# Altium footprint library Sirius.PcbLib: 58 footprints (part 2 of 4)
Each footprint in its own frame and in the unit in brackets; x right, y up, seen from the top. Pads: shape width x height; smd on the part's side, far side on the other; paste and mask are expansions set on the pad; w line width, h text height; cw(c..) or ccw(c..) is an arc to the next point about the centre after c.
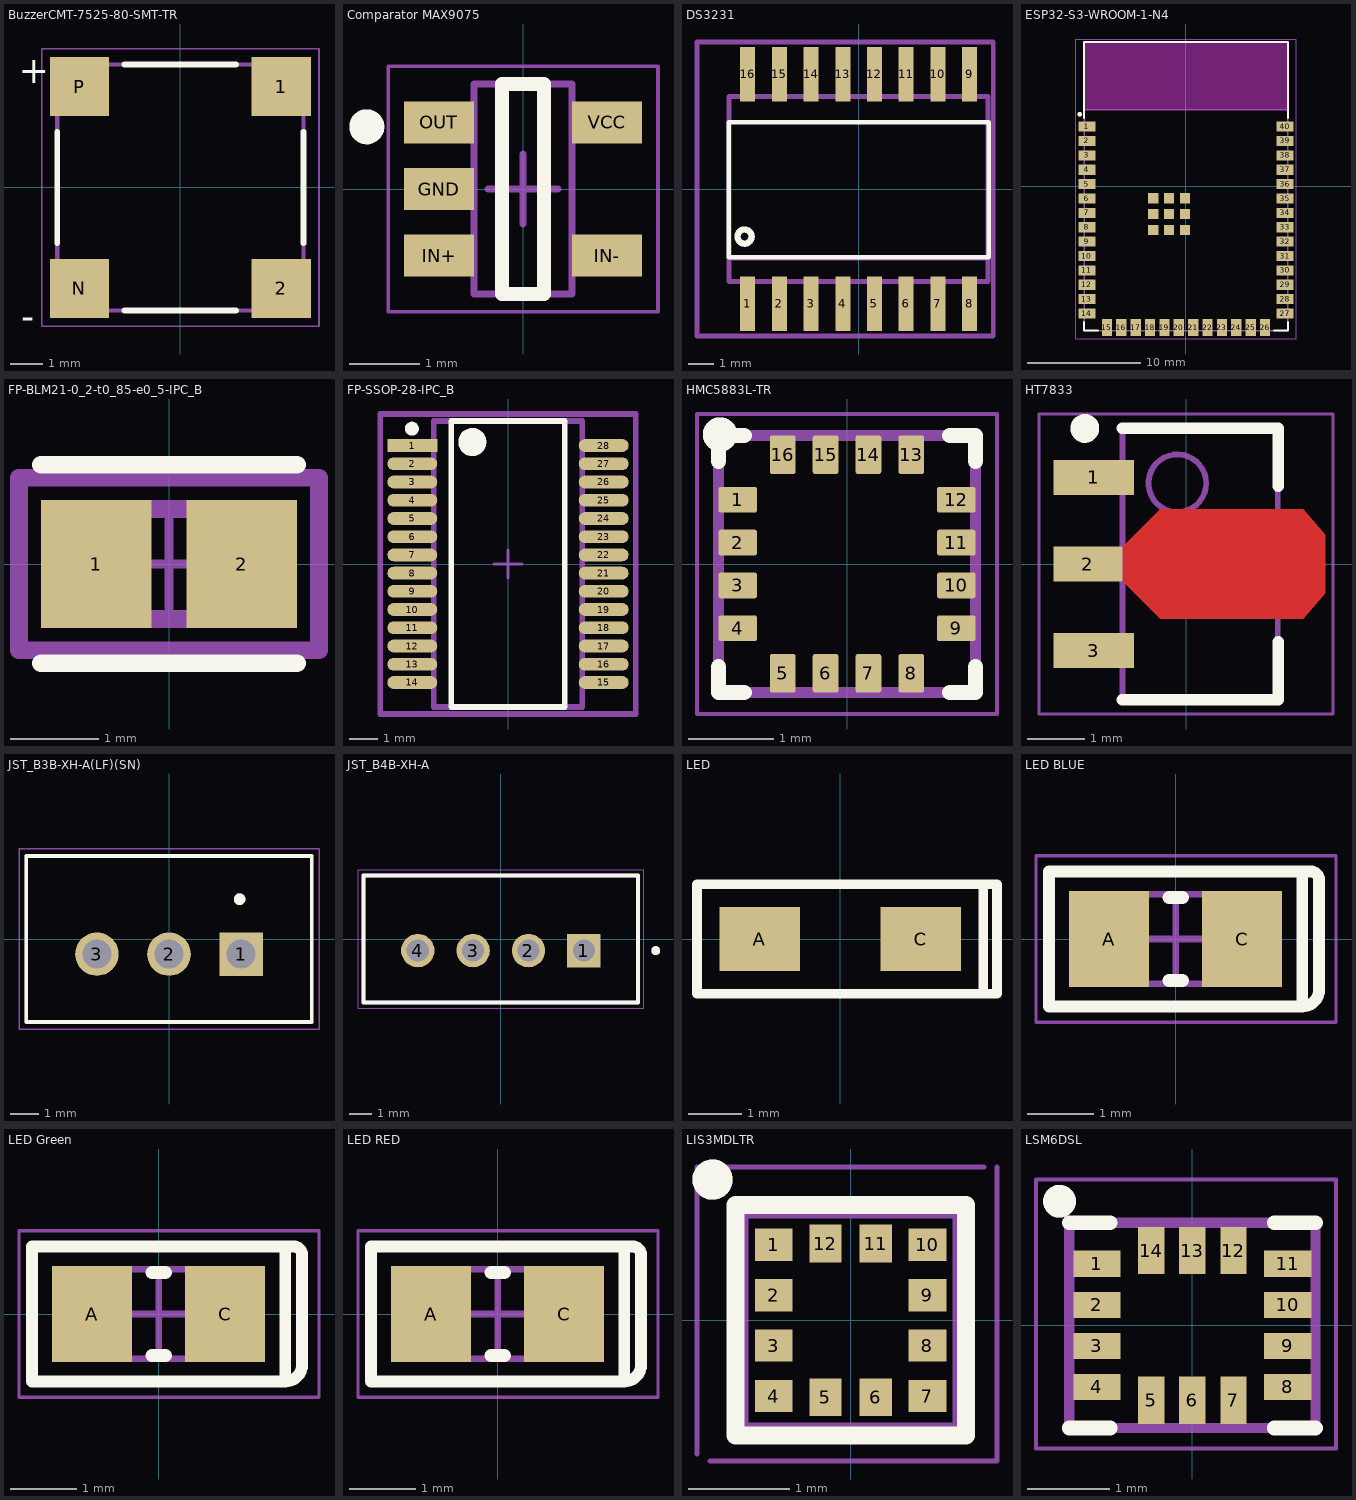
[diagram p1: the footprints below, top view; thin cyan lines are the x and y axes]

## BuzzerCMT-7525-80-SMT-TR [mm] "Passive Buzzer"
height 2.5
pads (4):
  rect 1.8x1.8 smd: 1(3.075,3.075) 2(3.075,-3.075) N(-3.075,-3.075) P(-3.075,3.075)
Top Overlay:
  lines w0.178: -3.75,-1.7 -3.75,1.7 ; -1.7,-3.75 1.7,-3.75 ; -1.7,3.75 1.7,3.75 ; 3.75,-1.7 3.75,1.7
  text "+" at -4.915,3.175 h0.81
  text "-" at -4.842,-4.318 h0.81
Mechanical 13:
  lines w0.127: -3.75,-3.75 -3.75,3.75 3.75,3.75 3.75,-3.75 -3.75,-3.75
  text "+" at -4.915,3.175 h0.81
  text "-" at -4.842,-4.318 h0.81
Mechanical 15:
  lines w0.05: -4.225,-4.225 4.225,-4.225 4.225,4.225 -4.225,4.225 -4.225,-4.225
3D body "Buzzzer CMT-7525-80-SMT-TR--3DModel-STEP-1.STEP": height 2.5, standoff 0, extent -3.75,-3.75 3.75,3.75

## Comparator MAX9075 [mm] "SOT23, 5-Leads, Body 2.90x2.45mm, Pitch 0.95mm, IPC Medium Density"
height 0.9
pads (5):
  rect 1x0.6 smd: GND(-1.2,0) IN+(-1.2,-0.95) IN-(1.2,-0.95) OUT(-1.2,0.95) VCC(1.2,0.95)
Top Overlay:
  circle w0.25: c-2.235,0.889 r0.125
  lines w0.2: -0.3,-1.5 -0.3,1.5 0.3,1.5 0.3,-1.5 -0.3,-1.5
Top Courtyard:
  lines w0.05: -1.925,-1.75 1.925,-1.75 1.925,1.75 -1.925,1.75 -1.925,-1.75
  lines w0.1: -0.5,0 0.5,0 ; 0,-0.5 0,0.5
Top Assembly:
  lines w0.1: -0.7,-1.5 0.7,-1.5 0.7,1.5 -0.7,1.5 -0.7,-1.5
3D body "SOT95P245X90-5N.step": height 0.9, standoff 0, extent -1.3,-1.5 1.3,1.5

## DS3231 [mm] "RTC"
pads (16):
  rect 0.6x2.2 smd: 1(-4.445,-4.6) 2(-3.175,-4.6) 3(-1.905,-4.6) 4(-0.635,-4.6) 5(0.635,-4.6) 6(1.905,-4.6) 7(3.175,-4.6) 8(4.445,-4.6) 9(4.445,4.6) 10(3.175,4.6) 11(1.905,4.6) 12(0.635,4.6) 13(-0.635,4.6) 14(-1.905,4.6) 15(-3.175,4.6) 16(-4.445,4.6)
Top Overlay:
  circle w0.254: c-4.572,-1.905 r0.284
  lines w0.178: -5.207,-2.743 5.207,-2.743 5.207,2.667 -5.207,2.667 -5.207,-2.743
Mechanical 13:
  region: -4.2,-5.32 -4.69,-5.32 -4.69,-3.8 -4.2,-3.8
  region: -2.93,-5.32 -3.42,-5.32 -3.42,-3.8 -2.93,-3.8
  region: -1.66,-5.32 -2.15,-5.32 -2.15,-3.8 -1.66,-3.8
  region: -0.39,-5.32 -0.88,-5.32 -0.88,-3.8 -0.39,-3.8
  region: 0.88,-5.32 0.39,-5.32 0.39,-3.8 0.88,-3.8
  region: 2.15,-5.32 1.66,-5.32 1.66,-3.8 2.15,-3.8
  region: 3.42,-5.32 2.93,-5.32 2.93,-3.8 3.42,-3.8
  region: 4.69,-5.32 4.2,-5.32 4.2,-3.8 4.69,-3.8
  region: 4.69,3.8 4.2,3.8 4.2,5.32 4.69,5.32
  region: 3.42,3.8 2.93,3.8 2.93,5.32 3.42,5.32
  region: 2.15,3.8 1.66,3.8 1.66,5.32 2.15,5.32
  region: 0.88,3.8 0.39,3.8 0.39,5.32 0.88,5.32
  region: -0.39,3.8 -0.88,3.8 -0.88,5.32 -0.39,5.32
  region: -1.66,3.8 -2.15,3.8 -2.15,5.32 -1.66,5.32
  region: -2.93,3.8 -3.42,3.8 -3.42,5.32 -2.93,5.32
  region: -4.2,3.8 -4.69,3.8 -4.69,5.32 -4.2,5.32
  lines w0.203: -5.19,-3.2 -5.19,3.7 5.19,3.7 5.19,-3.2 ; -5.19,-3.7 5.19,-3.7 5.19,-2.769 -5.19,-2.769 -5.19,-3.7
Mechanical 15:
  lines w0.2: -6.477,-5.9 5.395,-5.9 5.395,5.9 -6.477,5.9 -6.477,-5.9
3D body "step_temp.STEP": height 2.65, standoff 0, extent -5.15,-5.162 5.15,5.162

## ESP32-S3-WROOM-1-N4 [mm]
height 3.25
pads (49):
  rect 1.5x0.9 smd: 1(-8.75,5.26) 2(-8.75,3.99) 3(-8.75,2.72) 4(-8.75,1.45) 5(-8.75,0.18) 6(-8.75,-1.09) 7(-8.75,-2.36) 8(-8.75,-3.63) 9(-8.75,-4.9) 10(-8.75,-6.17) 11(-8.75,-7.44) 12(-8.75,-8.71) 13(-8.75,-9.98) 14(-8.75,-11.25) 27(8.75,-11.25) 28(8.75,-9.98) 29(8.75,-8.71) 30(8.75,-7.44) 31(8.75,-6.17) 32(8.75,-4.9) 33(8.75,-3.63) 34(8.75,-2.36) 35(8.75,-1.09) 36(8.75,0.18) 37(8.75,1.45) 38(8.75,2.72) 39(8.75,3.99) 40(8.75,5.26)
  rect 0.9x1.5 smd: 15(-6.985,-12.5) 16(-5.715,-12.5) 17(-4.445,-12.5) 18(-3.175,-12.5) 19(-1.905,-12.5) 20(-0.635,-12.5) 21(0.635,-12.5) 22(1.905,-12.5) 23(3.175,-12.5) 24(4.445,-12.5) 25(5.715,-12.5) 26(6.985,-12.5)
  rect 0.9x0.9 smd: 41_1(-1.5,-2.46) 41_2(-2.9,-2.46) 41_3(-0.1,-2.46) 41_4(-2.9,-3.86) 41_5(-1.5,-3.86) 41_6(-0.1,-3.86) 41_7(-2.9,-1.06) 41_8(-1.5,-1.06) 41_9(-0.1,-1.06)
Top Overlay:
  circle w0.2: c-9.398,6.35 r0.1
  lines w0.178: -9,-12.02 -9,-12.75 -7.755,-12.75 ; -9,6.03 -9,12.75 9,12.75 9,6.03 ; 7.755,-12.75 9,-12.75 9,-12.02
Keep-Out Layer:
  region: 9,6.75 -9,6.75 -9,12.75 9,12.75
  region: 9,6.75 -9,6.75 -9,12.75 9,12.75
Mechanical 13:
  circle w0.2: c-9.398,6.35 r0.1
  lines w0.127: -9,6.75 9,6.75 ; -9,6.75 -9,12.75 9,12.75 9,6.75 ; -9,6.75 -9,-12.75 9,-12.75 9,6.75
Mechanical 15:
  lines w0.05: -9.75,-13.5 9.75,-13.5 9.75,13 -9.75,13 -9.75,-13.5
3D body "ESP32-S3-WROOM-1-N4.STEP": height 3.25, standoff 0, extent -9,-12.75 9,12.75

## FP-BLM21-0_2-t0_85-e0_5-IPC_B [mm] "Murata-Ferrite Beads Multi-Layer 1KOhm 25% 100MHz 0.6A 0.27Ohm DCR 0805 T/R"
pads (2):
  rect 1.255x1.456 smd paste+0 mask+0: 1(-0.826,0) 2(0.826,0)
Top Overlay:
  lines w0.2: -1.453,-1.128 1.453,-1.128 ; -1.453,1.128 1.453,1.128
Top 3D Body:
  lines w0.2: -1,-0.625 -1,0.625 1,0.625 1,-0.625 -1,-0.625
Top Courtyard:
  lines w0.2: -1.703,-0.978 -1.703,0.978 1.703,0.978 1.703,-0.978 -1.703,-0.978
Top Assembly:
  lines w0.2: -1.703,-0.978 -1.703,0.978 1.703,0.978 1.703,-0.978 -1.703,-0.978
Top Component Center:
  lines w0.1: -0.5,0 0.5,0 ; 0,-0.5 0,0.5
3D body "FBead_Murata_BLM21AG102SN1D_eec.STEP": height 0.25, standoff 0, extent -1.703,-0.978 1.703,0.978

## FP-SSOP-28-IPC_B [mm]
pads (28):
  rect 1.782x0.455 smd paste+0 mask+0: 1(-3.414,4.225)
  rrect100% 1.782x0.455 smd paste+0 mask+0: 2(-3.414,3.575) 3(-3.414,2.925) 4(-3.414,2.275) 5(-3.414,1.625) 6(-3.414,0.975) 7(-3.414,0.325) 8(-3.414,-0.325) 9(-3.414,-0.975) 10(-3.414,-1.625) 11(-3.414,-2.275) 12(-3.414,-2.925) 13(-3.414,-3.575) 14(-3.414,-4.225) 15(3.414,-4.225) 16(3.414,-3.575) 17(3.414,-2.925) 18(3.414,-2.275) 19(3.414,-1.625) 20(3.414,-0.975) 21(3.414,-0.325) 22(3.414,0.325) 23(3.414,0.975) 24(3.414,1.625) 25(3.414,2.275) 26(3.414,2.925) 27(3.414,3.575) 28(3.414,4.225)
Top Overlay:
  circle w0.25: c-3.429,4.826 r0.125
  circle w0.5: c-1.273,4.35 r0.25
  lines w0.2: -2.023,-5.1 -2.023,5.1 2.023,5.1 2.023,-5.1 -2.023,-5.1
Top 3D Body:
  lines w0.2: -2.65,-5.1 -2.65,5.1 2.65,5.1 2.65,-5.1 -2.65,-5.1
Top Courtyard:
  lines w0.2: -4.555,-5.35 -4.555,5.35 4.555,5.35 4.555,-5.35 -4.555,-5.35
Top Assembly:
  lines w0.2: -4.555,-5.35 -4.555,5.35 4.555,5.35 4.555,-5.35 -4.555,-5.35
Top Component Center:
  lines w0.1: -0.5,0 0.5,0 ; 0,-0.5 0,0.5
3D body "IC_FTDI_FT232RL-REEL_eec.STEP": height 0.25, standoff 0, extent -4.555,-5.35 4.555,5.35

## HMC5883L-TR [mm]
pads (16):
  rrect17% 0.45x0.3 smd: 1(-1.275,0.75) 2(-1.275,0.25) 3(-1.275,-0.25) 4(-1.275,-0.75) 9(1.275,-0.75) 10(1.275,-0.25) 11(1.275,0.25) 12(1.275,0.75)
  rrect17% 0.3x0.45 smd: 5(-0.75,-1.275) 6(-0.25,-1.275) 7(0.25,-1.275) 8(0.75,-1.275) 13(0.75,1.275) 14(0.25,1.275) 15(-0.25,1.275) 16(-0.75,1.275)
Top Overlay:
  circle w0.2: c-1.481,1.512 r0.1
  lines w0.178: -1.5,-1.2 -1.5,-1.5 -1.2,-1.5 ; -1.5,1.2 -1.5,1.5 -1.2,1.5 ; 1.2,-1.5 1.5,-1.5 1.5,-1.2 ; 1.2,1.5 1.5,1.5 1.5,1.2
Mechanical 13:
  circle w0.2: c-1.481,1.512 r0.1
  lines w0.127: -1.5,-1.5 1.5,-1.5 1.5,1.5 -1.5,1.5 -1.5,-1.5
Mechanical 15:
  lines w0.05: -1.75,-1.75 -1.75,1.75 1.75,1.75 1.75,-1.75 -1.75,-1.75
3D body "HMC5883L-TR.STEP": height 0.9, standoff 0, extent -1.5,-1.5 1.5,1.5

## HT7833 [mm] "SOT89, 3-Leads, Body 4.54x2.49mm, Pitch 1.50mm, Lead Span 3.5mm, IPC Medium Density"
height 1.6
pads (3):
  rect 1.4x0.6 smd: 1(-1.6,1.5) 3(-1.6,-1.5)
  rect 1.2x0.6 smd: 2(-1.7,0)
Top Layer:
  region: -1.1,0.3 -0.45,0.95 2.032,0.95 2.413,0.508 2.413,-0.508 2.032,-0.95 -0.45,-0.95 -1.1,-0.3
Top Overlay:
  circle w0.25: c-1.755,2.35 r0.125
  lines w0.2: -1.105,-2.35 1.595,-2.35 1.595,-1.35 ; -1.105,2.35 1.595,2.35 1.595,1.35
Top Courtyard:
  lines w0.05: -2.55,-2.6 -2.55,2.6 2.55,2.6 2.55,-2.6 -2.55,-2.6
  lines w0.1: -0.255,0 0.745,0 ; 0.245,-0.5 0.245,0.5
Top Assembly:
  circle w0.1: c-0.15,1.4 r0.5
  lines w0.1: -1.1,-2.35 -1.1,2.35 1.59,2.35 1.59,-2.35 -1.1,-2.35
3D body "SOT89-150P350X160-3N.step": height 1.6, standoff 0, extent -2.246,-2.349 1.954,2.349

## JST_B3B-XH-A(LF)(SN) [mm]
height 7
pads (3):
  rect 1.508x1.508 / inner round 1.508 / far side rect 1.508x1.508 hole 1: 1(2.5,-0.525)
  round 1.508 hole 1: 2(0,-0.525) 3(-2.5,-0.525)
Top Overlay:
  circle w0.2: c2.448,1.38 r0.1
  lines w0.127: 4.95,-2.875 4.95,2.875 ; 4.95,-2.875 -4.95,-2.875 -4.95,2.875 4.95,2.875 ; 4.95,-2.875 4.95,2.875
Mechanical 13:
  circle w0.2: c2.448,1.38 r0.1
  lines w0.127: 4.95,-2.875 -4.95,-2.875 -4.95,2.875 4.95,2.875
Mechanical 15:
  lines w0.05: -5.2,-3.125 5.2,-3.125 5.2,3.125 -5.2,3.125 -5.2,-3.125
3D body "step_temp.STEP": height 7, standoff -3.4, extent -4.95,-2.875 4.95,2.875

## JST_B4B-XH-A [mm]
height 7
pads (4):
  rect 1.508x1.508 / inner round 1.508 / far side rect 1.508x1.508 hole 1: 1(3.75,-0.525)
  round 1.508 hole 1: 2(1.25,-0.525) 3(-1.25,-0.525) 4(-3.75,-0.525)
Top Overlay:
  circle w0.2: c7,-0.525 r0.1
  lines w0.178: -6.2,-2.875 6.2,-2.875 6.2,2.875 -6.2,2.875 -6.2,-2.875
Mechanical 13:
  circle w0.2: c7,-0.525 r0.1
  lines w0.178: -6.2,-2.875 6.2,-2.875 6.2,2.875 -6.2,2.875 -6.2,-2.875
Mechanical 15:
  lines w0.05: -6.45,-3.125 6.45,-3.125 6.45,3.125 -6.45,3.125 -6.45,-3.125
3D body "JST-B4B-XH-A.step": height 7, standoff -3.4, extent -6.177,-2.875 6.223,2.875

## LED [mm] "1206"
pads (2):
  rect 1.5x1.2 smd: A(-1.5,0) C(1.5,0)
Top Overlay:
  lines w0.178: 2.667,-1.016 2.667,1.016 ; -2.667,-1.016 2.921,-1.016 2.921,1.016 -2.667,1.016 -2.667,-1.016
3D body "LED.STEP": height 1.1, standoff 0, extent -1.6,-0.8 1.6,0.8

## LED BLUE [mm] "0805"
pads (2):
  rect 1.2x1.45 smd: A(-1,0) C(1,0)
Top Overlay:
  lines w0.178: 1.905,-1.016 ccw(c1.905,-0.762) 2.159,-0.762 2.159,0.889 ccw(c2.032,0.889) 2.032,1.016 1.905,1.016 ; 1.905,-1.016 -1.905,-1.016 -1.905,1.016 1.905,1.016 ; 1.905,-1.016 1.905,1.016
  lines w0.2: -0.1,-0.625 0.1,-0.625 ; -0.1,0.625 0.1,0.625
Mechanical 13:
  lines w0.1: -1.05,-0.675 1.05,-0.675 1.05,0.675 -1.05,0.675 -1.05,-0.675
Mechanical 15:
  lines w0.05: -2.1,-1.25 2.413,-1.25 2.413,1.25 -2.1,1.25 -2.1,-1.25
  lines w0.1: -0.5,0 0.5,0 ; 0,-0.5 0,0.5
3D body "SMD_0805LED_BLU.STEP": height 1.1, standoff 0, extent -1.01,-0.625 1.01,0.625

## LED Green [mm] "0805"
pads (2):
  rect 1.2x1.45 smd: A(-1,0) C(1,0)
Top Overlay:
  lines w0.178: 1.905,-1.016 ccw(c1.905,-0.762) 2.159,-0.762 2.159,0.889 ccw(c2.032,0.889) 2.032,1.016 1.905,1.016 ; 1.905,-1.016 1.905,1.016 ; 1.905,-1.016 -1.905,-1.016 -1.905,1.016 1.905,1.016
  lines w0.2: -0.1,-0.625 0.1,-0.625 ; -0.1,0.625 0.1,0.625
Mechanical 13:
  lines w0.1: -1.05,-0.675 -1.05,0.675 1.05,0.675 1.05,-0.675 -1.05,-0.675
Mechanical 15:
  lines w0.05: -2.1,-1.25 -2.1,1.25 2.413,1.25 2.413,-1.25 -2.1,-1.25
  lines w0.1: -0.5,0 0.5,0 ; 0,-0.5 0,0.5
3D body "LED-0805-green.step": height 0.8, standoff -0.01, extent -1,-0.625 1,0.625

## LED RED [mm] "0805"
pads (2):
  rect 1.2x1.45 smd: A(-1,0) C(1,0)
Top Overlay:
  lines w0.178: 1.905,-1.016 ccw(c1.905,-0.762) 2.159,-0.762 2.159,0.889 ccw(c2.032,0.889) 2.032,1.016 1.905,1.016 ; 1.905,-1.016 1.905,1.016 ; 1.905,-1.016 -1.905,-1.016 -1.905,1.016 1.905,1.016
  lines w0.2: -0.1,-0.625 0.1,-0.625 ; -0.1,0.625 0.1,0.625
Mechanical 13:
  lines w0.1: -1.05,-0.675 -1.05,0.675 1.05,0.675 1.05,-0.675 -1.05,-0.675
Mechanical 15:
  lines w0.05: -2.1,-1.25 -2.1,1.25 2.413,1.25 2.413,-1.25 -2.1,-1.25
  lines w0.1: -0.5,0 0.5,0 ; 0,-0.5 0,0.5
3D body "SMD_0805LED_RED.STEP": height 1.1, standoff 0, extent -1.01,-0.625 1.01,0.625

## LIS3MDLTR [mm]
pads (12):
  rect 0.375x0.32 smd mask+0: 1(-0.763,0.75) 2(-0.763,0.25) 3(-0.763,-0.25) 4(-0.763,-0.75) 7(0.763,-0.75) 8(0.763,-0.25) 9(0.763,0.25) 10(0.763,0.75)
  rect 0.32x0.375 smd mask+0: 5(-0.25,-0.763) 6(0.25,-0.763) 11(0.25,0.763) 12(-0.25,0.763)
Top Overlay:
  circle w0.2: c-1.37,1.397 r0.1
  lines w0.178: -1.143,-1.143 1.143,-1.143 1.143,1.143 -1.143,1.143 -1.143,-1.143
Top Solder:
  region: -0.525,0.525 -1,0.525 -1,0.975 -0.525,0.975
  region: 0.475,-1 0.025,-1 0.025,-0.525 0.475,-0.525
  region: 0.475,0.525 0.025,0.525 0.025,1 0.475,1
  region: -0.025,0.525 -0.475,0.525 -0.475,1 -0.025,1
  region: -0.025,-1 -0.475,-1 -0.475,-0.525 -0.025,-0.525
  region: 1,-0.975 0.525,-0.975 0.525,-0.525 1,-0.525
  region: 1,-0.475 0.525,-0.475 0.525,-0.025 1,-0.025
  region: 1,0.025 0.525,0.025 0.525,0.475 1,0.475
  region: -0.525,-0.975 -1,-0.975 -1,-0.525 -0.525,-0.525
  region: -0.525,-0.475 -1,-0.475 -1,-0.025 -0.525,-0.025
  region: -0.525,0.025 -1,0.025 -1,0.475 -0.525,0.475
  region: 1,0.525 0.525,0.525 0.525,0.975 1,0.975
Mechanical 13:
  circle w0.2: c-1.37,1.397 r0.1
  lines w0.127: -1.075,-1.075 1.075,-1.075 1.075,1.075 -1.075,1.075 -1.075,-1.075
Mechanical 15:
  lines w0.05: -1.524,-1.325 -1.524,1.524 1.325,1.524 ; -1.397,-1.397 1.452,-1.397 1.452,1.524
3D body "LIS3MDLTR.step": height 1, standoff 0, extent -1,-1 1,1

## LSM6DSL [mm] "IMU"
height 0.86
pads (14):
  rect 0.575x0.32 smd mask+0.05: 1(-1.162,0.75) 2(-1.162,0.25) 3(-1.162,-0.25) 4(-1.162,-0.75) 8(1.162,-0.75) 9(1.162,-0.25) 10(1.162,0.25) 11(1.162,0.75)
  rect 0.32x0.575 smd mask+0.05: 5(-0.5,-0.913) 6(0,-0.913) 7(0.5,-0.913) 12(0.5,0.913) 13(0,0.913) 14(-0.5,0.913)
Top Overlay:
  circle w0.2: c-1.619,1.512 r0.1
  lines w0.178: -1.5,-1.25 -1,-1.25 ; -1.5,1.25 -1,1.25 ; 1,-1.25 1.5,-1.25 ; 1,1.25 1.5,1.25
Mechanical 13:
  circle w0.2: c-1.619,1.512 r0.1
  lines w0.127: -1.5,-1.25 -1.5,1.25 1.5,1.25 1.5,-1.25 -1.5,-1.25
Mechanical 15:
  lines w0.05: -1.905,-1.5 1.75,-1.5 1.75,1.778 -1.905,1.778 -1.905,-1.5
3D body "step_temp.STEP": height 0.86, standoff 0, extent -1.5,-1.25 1.5,1.25